# Altium footprint library Connectors.PcbLib: 268 footprints (part 9 of 21) (continued)
## CNMCH340-12 [mm] "MCH-1,2 horizontal connector plug 340 pin" (continued)
3D body: height -0.75, standoff -0.76, extent 5,1.539 5.483,7.495
3D body: height -0.75, standoff -0.76, extent 5.75,1.539 6.233,7.495
3D body: height -0.75, standoff -0.76, extent 2,0.777 2.483,7.495
3D body: height -0.75, standoff -0.76, extent 2.75,1.539 3.233,7.495
3D body: height -0.75, standoff -0.76, extent 3.5,1.539 3.983,7.495
3D body: height -0.75, standoff -0.76, extent -0.25,0.777 0.233,7.495
3D body: height -0.75, standoff -0.76, extent 0.5,1.539 0.983,7.495
3D body: height -0.75, standoff -0.76, extent 1.25,1.539 1.733,7.495
3D body: height -0.75, standoff -0.76, extent -2.5,0.777 -2.017,7.495
3D body: height -0.75, standoff -0.76, extent -1.75,1.539 -1.267,7.495
3D body: height -0.75, standoff -0.76, extent -1,1.539 -0.517,7.495
3D body: height -0.75, standoff -0.76, extent -4.75,0.777 -4.267,7.495
3D body: height -0.75, standoff -0.76, extent -4,1.539 -3.517,7.495
3D body: height -0.75, standoff -0.76, extent -3.25,1.539 -2.767,7.495
3D body: height -0.75, standoff -0.76, extent -7,0.777 -6.517,7.495
3D body: height -0.75, standoff -0.76, extent -6.25,1.539 -5.767,7.495
3D body: height -0.75, standoff -0.76, extent -5.5,1.539 -5.017,7.495
3D body: height -0.75, standoff -0.76, extent -9.25,0.777 -8.767,7.495
3D body: height -0.75, standoff -0.76, extent -8.5,1.539 -8.017,7.495
3D body: height -0.75, standoff -0.76, extent -7.75,1.539 -7.267,7.495
3D body: height -0.75, standoff -0.76, extent -11.5,0.777 -11.017,7.495
3D body: height -0.75, standoff -0.76, extent -10.75,1.539 -10.267,7.495
3D body: height -0.75, standoff -0.76, extent -10,1.539 -9.517,7.495
3D body: height -0.75, standoff -0.76, extent -13.75,0.777 -13.267,7.495
3D body: height -0.75, standoff -0.76, extent -13,1.539 -12.517,7.495
3D body: height -0.75, standoff -0.76, extent -12.25,1.539 -11.767,7.495
3D body: height -0.75, standoff -0.76, extent -16,0.777 -15.517,7.495
3D body: height -0.75, standoff -0.76, extent -15.25,1.539 -14.767,7.495
3D body: height -0.75, standoff -0.76, extent -14.5,1.539 -14.017,7.495
3D body: height -0.75, standoff -0.76, extent -18.25,0.777 -17.767,7.495
3D body: height -0.75, standoff -0.76, extent -17.5,1.539 -17.017,7.495
3D body: height -0.75, standoff -0.76, extent -16.75,1.539 -16.267,7.495
3D body: height -0.75, standoff -0.76, extent -20.5,0.777 -20.017,7.495
3D body: height -0.75, standoff -0.76, extent -19.75,1.539 -19.267,7.495
3D body: height -0.75, standoff -0.76, extent -19,1.539 -18.517,7.495
3D body: height -0.75, standoff -0.76, extent -22.75,0.777 -22.267,7.495
3D body: height -0.75, standoff -0.76, extent -22,1.539 -21.517,7.495
3D body: height -0.75, standoff -0.76, extent -21.25,1.539 -20.767,7.495
3D body: height -0.75, standoff -0.76, extent -25,0.777 -24.517,7.495
3D body: height -0.75, standoff -0.76, extent -24.25,1.539 -23.767,7.495
3D body: height -0.75, standoff -0.76, extent -23.5,1.539 -23.017,7.495
3D body: height -0.75, standoff -0.76, extent -27.25,0.777 -26.767,7.495
3D body: height -0.75, standoff -0.76, extent -26.5,1.539 -26.017,7.495
3D body: height -0.75, standoff -0.76, extent -25.75,1.539 -25.267,7.495
3D body: height -0.75, standoff -0.76, extent -29.5,0.777 -29.017,7.495
3D body: height -0.75, standoff -0.76, extent -28.75,1.539 -28.267,7.495
3D body: height -0.75, standoff -0.76, extent -28,1.539 -27.517,7.495
3D body: height -0.75, standoff -0.76, extent -30.25,1.539 -29.767,7.495
3D body: height -0.75, standoff -0.76, extent -31,1.539 -30.517,7.495
3D body: height -0.75, standoff -0.76, extent -31.75,0.777 -31.267,7.495
3D body: height 0.76, standoff 0.75, extent 29,0.766 29.483,7.495
3D body: height 0.76, standoff 0.75, extent 26.75,0.777 27.233,7.495
3D body: height 0.76, standoff 0.75, extent 27.5,1.223 27.983,7.495
3D body: height 0.76, standoff 0.75, extent 28.25,1.223 28.733,7.495
3D body: height 0.76, standoff 0.75, extent 31.267,0.777 31.75,7.495
3D body: height 0.76, standoff 0.75, extent 30.517,0.766 31,7.495
3D body: height 0.76, standoff 0.75, extent 29.767,2.112 30.25,7.495
3D body: height 0.76, standoff 0.75, extent 24.5,0.777 24.983,7.495
3D body: height 0.76, standoff 0.75, extent 25.25,0.766 25.733,7.495
3D body: height 0.76, standoff 0.75, extent 26,1.223 26.483,7.495
3D body: height 0.76, standoff 0.75, extent 22.25,0.777 22.733,7.495
3D body: height 0.76, standoff 0.75, extent 23,1.539 23.483,7.495
3D body: height 0.76, standoff 0.75, extent 23.75,1.539 24.233,7.495
3D body: height 0.76, standoff 0.75, extent 20,0.777 20.483,7.495
3D body: height 0.76, standoff 0.75, extent 20.75,1.539 21.233,7.495
3D body: height 0.76, standoff 0.75, extent 21.5,1.539 21.983,7.495
3D body: height 0.76, standoff 0.75, extent 17.75,0.777 18.233,7.495
3D body: height 0.76, standoff 0.75, extent 18.5,0.766 18.983,7.495
3D body: height 0.76, standoff 0.75, extent 19.25,1.223 19.733,7.495
3D body: height 0.76, standoff 0.75, extent 15.5,0.777 15.983,7.495
3D body: height 0.76, standoff 0.75, extent 16.25,1.539 16.733,7.495
3D body: height 0.76, standoff 0.75, extent 17,1.539 17.483,7.495
3D body: height 0.76, standoff 0.75, extent 13.25,0.777 13.733,7.495
3D body: height 0.76, standoff 0.75, extent 14,1.539 14.483,7.495
3D body: height 0.76, standoff 0.75, extent 14.75,1.539 15.233,7.495
3D body: height 0.76, standoff 0.75, extent 11,0.777 11.483,7.495
3D body: height 0.76, standoff 0.75, extent 11.75,0.766 12.233,7.495
3D body: height 0.76, standoff 0.75, extent 12.5,1.223 12.983,7.495
3D body: height 0.76, standoff 0.75, extent 8.75,0.777 9.233,7.495
3D body: height 0.76, standoff 0.75, extent 9.5,1.539 9.983,7.495
3D body: height 0.76, standoff 0.75, extent 10.25,1.539 10.733,7.495
3D body: height 0.76, standoff 0.75, extent 6.5,0.777 6.983,7.495
3D body: height 0.76, standoff 0.75, extent 7.25,1.539 7.733,7.495
3D body: height 0.76, standoff 0.75, extent 8,1.539 8.483,7.495
3D body: height 0.76, standoff 0.75, extent 4.25,0.777 4.733,7.495
3D body: height 0.76, standoff 0.75, extent 5,1.539 5.483,7.495
3D body: height 0.76, standoff 0.75, extent 5.75,1.539 6.233,7.495
3D body: height 0.76, standoff 0.75, extent 2,0.777 2.483,7.495
3D body: height 0.76, standoff 0.75, extent 2.75,1.539 3.233,7.495
3D body: height 0.76, standoff 0.75, extent 3.5,1.539 3.983,7.495
3D body: height 0.76, standoff 0.75, extent -0.25,0.777 0.233,7.495
3D body: height 0.76, standoff 0.75, extent 0.5,0.766 0.983,7.495
3D body: height 0.76, standoff 0.75, extent 1.25,1.223 1.733,7.495
3D body: height 0.76, standoff 0.75, extent -2.5,0.777 -2.017,7.495
3D body: height 0.76, standoff 0.75, extent -1.75,1.539 -1.267,7.495
3D body: height 0.76, standoff 0.75, extent -1,1.539 -0.517,7.495
3D body: height 0.76, standoff 0.75, extent -4.75,0.777 -4.267,7.495
3D body: height 0.76, standoff 0.75, extent -4,1.539 -3.517,7.495
3D body: height 0.76, standoff 0.75, extent -3.25,1.539 -2.767,7.495
3D body: height 0.76, standoff 0.75, extent -7,0.777 -6.517,7.495
3D body: height 0.76, standoff 0.75, extent -6.25,1.539 -5.767,7.495
3D body: height 0.76, standoff 0.75, extent -5.5,1.539 -5.017,7.495
3D body: height 0.76, standoff 0.75, extent -9.25,0.777 -8.767,7.495
3D body: height 0.76, standoff 0.75, extent -8.5,1.539 -8.017,7.495
3D body: height 0.76, standoff 0.75, extent -7.75,1.539 -7.267,7.495
3D body: height 0.76, standoff 0.75, extent -11.5,0.777 -11.017,7.495
3D body: height 0.76, standoff 0.75, extent -10.75,0.766 -10.267,7.495
3D body: height 0.76, standoff 0.75, extent -10,1.223 -9.517,7.495
3D body: height 0.76, standoff 0.75, extent -13.75,0.777 -13.267,7.495
3D body: height 0.76, standoff 0.75, extent -13,1.539 -12.517,7.495
3D body: height 0.76, standoff 0.75, extent -12.25,1.539 -11.767,7.495
3D body: height 0.76, standoff 0.75, extent -16,0.777 -15.517,7.495
3D body: height 0.76, standoff 0.75, extent -15.25,1.539 -14.767,7.495
3D body: height 0.76, standoff 0.75, extent -14.5,1.539 -14.017,7.495
3D body: height 0.76, standoff 0.75, extent -18.25,0.777 -17.767,7.495
3D body: height 0.76, standoff 0.75, extent -17.5,1.539 -17.017,7.495
3D body: height 0.76, standoff 0.75, extent -16.75,1.539 -16.267,7.495
3D body: height 0.76, standoff 0.75, extent -20.5,0.777 -20.017,7.495
3D body: height 0.76, standoff 0.75, extent -19.75,1.539 -19.267,7.495
3D body: height 0.76, standoff 0.75, extent -19,1.539 -18.517,7.495
3D body: height 0.76, standoff 0.75, extent -22.75,0.777 -22.267,7.495
3D body: height 0.76, standoff 0.75, extent -22,0.766 -21.517,7.495
3D body: height 0.76, standoff 0.75, extent -21.25,1.223 -20.767,7.495
3D body: height 0.76, standoff 0.75, extent -25,0.777 -24.517,7.495
3D body: height 0.76, standoff 0.75, extent -24.25,1.539 -23.767,7.495
3D body: height 0.76, standoff 0.75, extent -23.5,1.539 -23.017,7.495
3D body: height 0.76, standoff 0.75, extent -27.25,0.777 -26.767,7.495
3D body: height 0.76, standoff 0.75, extent -26.5,1.539 -26.017,7.495
3D body: height 0.76, standoff 0.75, extent -25.75,1.539 -25.267,7.495
3D body: height 0.76, standoff 0.75, extent -29.5,0.777 -29.017,7.495
3D body: height 0.76, standoff 0.75, extent -28.75,1.539 -28.267,7.495
3D body: height 0.76, standoff 0.75, extent -28,1.539 -27.517,7.495
3D body: height 0.76, standoff 0.75, extent -30.25,1.223 -29.767,7.495
3D body: height 0.76, standoff 0.75, extent -31,0.766 -30.517,7.495
3D body: height 0.76, standoff 0.75, extent -31.75,0.777 -31.267,7.495
3D body: height 9.01, standoff -3.01, extent 31.464,10.459 33.953,12.949
3D body: height 9.01, standoff -3.01, extent -33.953,10.459 -31.464,12.949
3D body: height -1.6, standoff -4.7, extent -35,20.5 35,35.5

## CNMMCX_J_EDGE [mm] "MMCX PCB edge female"
height 7.925
pads (4):
  rect 2x1.1 smd: 1(2,0)
  rect 2x1.4 smd: 2(2,-1.6) 2(2,1.6)
  rect 1.8x1.4 smd far side: 2(2,1.6)
Top Layer:
  region: 3,-0.9 0,-0.9 0,-1.75 -4.5,-1.75 -4.5,-2.6 3,-2.6
  region: 3,0.9 0,0.9 0,1.75 -4.5,1.75 -4.5,2.6 3,2.6
Bottom Layer:
  region: 3,0 1.1,0 1.1,-1.75 -4.5,-1.75 -4.5,-2.6 3,-2.6
  region: 3,0 1.1,0 1.1,1.75 -4.5,1.75 -4.5,2.6 3,2.6
Mechanical 13:
  lines w0.254: -4.5,-2.25 3,-2.25 3,2.25 -4.5,2.25 -4.5,-2.25
Mechanical 15:
  lines w0.254: -4.5,-2.6 -4.5,-1.75 ; -4.5,2.6 -4.5,1.75 ; -0.6,0 0,0 ; 0,-0.6 0,0 ; 0,0.6 0,0 ; 0.6,0 0,0 ; -4.5,-1.75 0,-1.75 0,1.75 -4.5,1.75 ; -4.5,-1.75 -4.5,-1.75 ; -4.5,1.75 -4.5,1.75
3D body "c-1408152-01-e-3d.stp": height 2.11, standoff -1.39, extent -4.5,-2.25 3,2.25

## CNPC4POWV [mm] "PC power  connector 4 pin"
height 10.16
pads (4):
  rrect50% 3.5x3.5 hole 1.8: 1(0,0)
  round 3.5 hole 1.8: 2(5,0) 3(10,0) 4(15,0)
Mechanical 13:
  circle w0.1: c0,0 r0.9
  circle w0.1: c5,0 r0.9
  circle w0.1: c10,0 r0.9
  circle w0.1: c15,0 r0.9
  lines w0.1: -4.1,-2.3 -4.1,4.1 19.5,4.1 19.5,-2.3 ; -4.1,-2.3 -2.3,-4.1 ; -4.1,-2.3 -4.1,-2.9 ccw(c-2.9,-2.9) -2.9,-4.1 -2.3,-4.1 ; -2.3,-4.1 17.7,-4.1 ; 17.7,-4.1 19.5,-2.3 ; 17.7,-4.1 18.3,-4.1 ccw(c18.3,-2.9) 19.5,-2.9 19.5,-2.3 ; -3.2,-1.8 -1.8,-3.2 17.2,-3.2 18.6,-1.8 18.6,3.2 -3.2,3.2 -3.2,-1.8
3D body: height 1.5, standoff 0, extent -4.1,-4.1 19.5,4.1
3D body: height 10.16, standoff 1.5, extent -4.1,-4.1 19.5,4.1
3D body: height 8.3, standoff 0, extent -0.9,-0.9 0.9,0.9
3D body: height 8.3, standoff 0, extent 4.1,-0.9 5.9,0.9
3D body: height 8.3, standoff 0, extent 9.1,-0.9 10.9,0.9
3D body: height 8.3, standoff 0, extent 14.1,-0.9 15.9,0.9

## CNPCIE_X1_18H [mm] "Connector PCI Express Horizontal female, SMTP; 18 pin; R0.64 mm; Body 30.48 x 13.79 x 7.65 mm (LxWxH)"
height 7.65
pads (58):
  round 0.7 on Mech12: 1(10.871,4.126) 2(12.071,4.126) 3(13.271,4.126) 4(13.265,2.425) 5(13.265,1.225) 6(13.265,0.025) 7(13.271,-1.626) 8(12.071,-1.626) 9(10.871,-1.626) 10(10.865,0.025) 11(10.865,1.225) 12(10.865,2.425) 13(-10.859,-1.626) 14(-12.059,-1.626) 15(-13.259,-1.626) 16(-13.265,0.025) 17(-10.865,0.025) 18(-10.865,1.225) 19(-13.265,1.225) 20(-13.265,2.425) 21(-10.865,2.425) 22(-10.859,4.126) 23(-12.059,4.126) 24(-13.259,4.126)
  rect 1.55x2.05 on Top Paste: 14(-13,-1.175) 14(-13,1.225) 14(-13,3.625) 14(-11.118,-1.175) 14(-11.118,1.225) 14(-11.118,3.625) 14(11.118,-1.175) 14(11.118,1.225) 14(11.118,3.625) 14(13,-1.175) 14(13,1.225) 14(13,3.625)
  rect 0.43x2.67 smd: A1(5.46,3.405) A2(4.18,3.405) A3(2.9,3.405) A4(1.62,3.405) A5(0.34,3.405) A6(-0.94,3.405) A7(-2.22,3.405) A8(-3.5,3.405) A9(-4.78,3.405) B1(4.82,3.405) B2(3.54,3.405) B3(2.26,3.405) B4(0.98,3.405) B5(-0.3,3.405) B6(-1.58,3.405) B7(-2.86,3.405) B8(-4.14,3.405) B9(-5.42,3.405)
  rect 3.68x7.03 smd paste-5.08: MH1(-12.065,1.225) MH2(12.065,1.225)
  round 1.524 hole 2.2 unplated mask+0.5: MH3(-7.35,0.076) MH4(7.35,0)
via 12.071,-1.626 diameter 0.65 hole 0.3
via 10.871,-1.626 diameter 0.65 hole 0.3
via 13.271,-1.626 diameter 0.65 hole 0.3
via 13.271,4.126 diameter 0.65 hole 0.3
via 10.871,4.126 diameter 0.65 hole 0.3
via 12.071,4.126 diameter 0.65 hole 0.3
via 10.865,2.425 diameter 0.65 hole 0.3
via 10.865,0.025 diameter 0.65 hole 0.3
via 10.865,1.225 diameter 0.65 hole 0.3
via 13.265,1.225 diameter 0.65 hole 0.3
via 13.265,0.025 diameter 0.65 hole 0.3
via 13.265,2.425 diameter 0.65 hole 0.3
via -10.865,2.425 diameter 0.65 hole 0.3
via -10.865,0.025 diameter 0.65 hole 0.3
via -10.865,1.225 diameter 0.65 hole 0.3
via -13.265,1.225 diameter 0.65 hole 0.3
via -13.265,0.025 diameter 0.65 hole 0.3
via -13.265,2.425 diameter 0.65 hole 0.3
via -12.059,4.126 diameter 0.65 hole 0.3
via -13.259,4.126 diameter 0.65 hole 0.3
via -10.859,4.126 diameter 0.65 hole 0.3
via -10.859,-1.626 diameter 0.65 hole 0.3
via -13.259,-1.626 diameter 0.65 hole 0.3
via -12.059,-1.626 diameter 0.65 hole 0.3
Mechanical 13:
  lines w0.102: -13.657,-6.832 -13.657,-10.832 -10.457,-10.832 -10.457,-6.832 ; -13.357,-4.232 -13.357,-3.032 ; -12.957,-6.832 -12.957,-4.232 ; -11.157,-6.832 -11.157,-4.232 ; -10.757,-4.232 -10.757,-3.032 ; -7.94,-3.06 -7.94,-9.4 7.94,-9.4 7.94,-3.06 ; 10.473,-6.832 10.473,-10.832 13.673,-10.832 13.673,-6.832 ; 10.773,-4.232 10.773,-3.032 ; 11.173,-6.832 11.173,-4.232 ; 12.973,-6.832 12.973,-4.232 ; 13.373,-4.232 13.373,-3.032 ; -15.24,-3.05 -15.24,4.75 -7.94,4.75 -7.94,2.515 7.94,2.515 7.94,4.75 15.24,4.75 15.24,-3.05 -15.24,-3.05 ; -13.857,-6.832 -13.857,-4.232 -10.257,-4.232 -10.257,-6.832 -13.857,-6.832 ; 10.273,-6.832 10.273,-4.232 13.873,-4.232 13.873,-6.832 10.273,-6.832
Mechanical 15:
  lines w0.102: -15.8,-3.4 -15.8,6 15.8,6 15.8,-3.4 8.475,-3.4 8.475,-9.97 -8.525,-9.97 -8.525,-3.4 -15.8,-3.4
3D body: height 5.1, standoff 2.51, extent 10.763,-4.232 13.357,-3.05
3D body: height 5.6, standoff 2.01, extent 10.265,-6.832 13.857,-4.232
3D body: height 5.4, standoff 2.21, extent 10.464,-10.832 13.657,-6.832
3D body: height 5.4, standoff 2.21, extent -13.657,-10.832 -10.464,-6.832
3D body: height 5.6, standoff 2.01, extent -13.857,-6.832 -10.265,-4.232
3D body: height 5.1, standoff 2.51, extent -13.357,-4.232 -10.763,-3.05
3D body: height 0, standoff -1.78, extent -8.45,-1.024 -6.25,1.176
3D body: height 0, standoff -1.78, extent 6.25,-1.1 8.45,1.1
3D body: height 7.5, standoff 0, extent -15.24,-3.04 15.24,-2.3
3D body: height 7.65, standoff 7, extent -15.24,-3.05 15.24,2.083
3D body: height 6.78, standoff 1.7, extent -7.976,-9.4 7.915,-3.05
3D body: height 7, standoff 0, extent -15.24,-2.311 15.24,4.75
3D body: height 6.3, standoff 2.2, extent -7.569,-9.423 7.569,-9.4

## CNPCIEX1EDGE [mm] "PCIexpress connector for board edge 2x18 pin (11+7)"
pads (36):
  rect 0.7x3.2 smd far side: A1(0,0.5)
  rect 0.7x4.2 smd far side: A2(1,0) A3(2,0) A4(3,0) A5(4,0) A6(5,0) A7(6,0) A8(7,0) A9(8,0) A10(9,0) A11(10,0) A12(13,0) A13(14,0) A14(15,0) A15(16,0) A16(17,0) A17(18,0) A18(19,0)
  rect 0.7x4.2 smd: B1(0,0) B2(1,0) B3(2,0) B4(3,0) B5(4,0) B6(5,0) B7(6,0) B8(7,0) B9(8,0) B10(9,0) B11(10,0) B12(13,0) B13(14,0) B14(15,0) B15(16,0) B16(17,0) B18(19,0)
  rect 0.7x3.2 smd: B17(18,0.5)
Mechanical 15:
  lines w0.127: -2.9,7.3 -0.65,7.3 -0.65,-2.725 0.125,-3.5 9.85,-3.5 10.55,-2.8 10.55,2.625 cw(c11.5,2.625) 12.45,2.625 12.45,-2.775 13.175,-3.5 18.925,-3.5 19.65,-2.775 19.65,7.3 22.2,7.3

## CNPCIEX4EDGE [mm] "PCIexpress connector for board edge 2x32 pin"
pads (64):
  rect 0.7x3.2 smd far side paste-3: A1(0,0.5)
  rect 0.7x4.2 smd far side paste-3: A2(1,0) A3(2,0) A4(3,0) A5(4,0) A6(5,0) A7(6,0) A8(7,0) A9(8,0) A10(9,0) A11(10,0) A12(13,0) A13(14,0) A14(15,0) A15(16,0) A16(17,0) A17(18,0) A18(19,0) A19(20,0) A20(21,0) A21(22,0) A22(23,0) A23(24,0) A24(25,0) A25(26,0) A26(27,0) A27(28,0) A28(29,0) A29(30,0) A30(31,0) A31(32,0) A32(33,0)
  rect 0.7x4.2 smd paste-3: B1(0,0) B2(1,0) B3(2,0) B4(3,0) B5(4,0) B6(5,0) B7(6,0) B8(7,0) B9(8,0) B10(9,0) B11(10,0) B12(13,0) B13(14,0) B14(15,0) B15(16,0) B16(17,0) B18(19,0) B19(20,0) B20(21,0) B21(22,0) B22(23,0) B23(24,0) B24(25,0) B25(26,0) B26(27,0) B27(28,0) B28(29,0) B29(30,0) B30(31,0) B32(33,0)
  rect 0.7x3.2 smd paste-3: B17(18,0.5) B31(32,0.5)
Top Solder:
  region: -0.65,2.2 -0.65,-2.75 0.1,-3.5 9.8,-3.5 10.55,-2.75 10.55,2.2
  region: 12.45,2.2 12.45,-2.75 13.2,-3.5 32.9,-3.5 33.65,-2.75 33.65,2.2
Bottom Solder:
  region: -0.65,2.2 -0.65,-2.75 0.1,-3.5 9.8,-3.5 10.55,-2.75 10.55,2.2
  region: 12.45,2.2 12.45,-2.75 13.2,-3.5 32.9,-3.5 33.65,-2.75 33.65,2.2
Mechanical 15:
  lines w0.127: -2.9,7.3 -1.15,7.3 -0.65,6.8 -0.65,-2.75 0.1,-3.5 9.8,-3.5 10.55,-2.75 10.55,2.625 cw(c11.5,2.625) 12.45,2.625 12.45,-2.75 13.2,-3.5 32.9,-3.5 33.65,-2.75 33.65,6.8 34.15,7.3 36.2,7.3

## CNPCIEX8EDGE [mm] "PCIexpress connector for board edge 2x49 pin"
pads (98):
  rect 0.7x3.2 smd far side paste-3: A1(-11.5,4)
  rect 0.7x4.2 smd far side paste-3: A2(-10.5,3.5) A3(-9.5,3.5) A4(-8.5,3.5) A5(-7.5,3.5) A6(-6.5,3.5) A7(-5.5,3.5) A8(-4.5,3.5) A9(-3.5,3.5) A10(-2.5,3.5) A11(-1.5,3.5) A12(1.5,3.5) A13(2.5,3.5) A14(3.5,3.5) A15(4.5,3.5) A16(5.5,3.5) A17(6.5,3.5) A18(7.5,3.5) A19(8.5,3.5) A20(9.5,3.5) A21(10.5,3.5) A22(11.5,3.5) A23(12.5,3.5) A24(13.5,3.5) A25(14.5,3.5) A26(15.5,3.5) A27(16.5,3.5) A28(17.5,3.5) A29(18.5,3.5) A30(19.5,3.5) A31(20.5,3.5) A32(21.5,3.5) A33(22.5,3.5) A34(23.5,3.5) A35(24.5,3.5) A36(25.5,3.5) A37(26.5,3.5) A38(27.5,3.5) A39(28.5,3.5) A40(29.5,3.5) A41(30.5,3.5) A42(31.5,3.5) A43(32.5,3.5) A44(33.5,3.5) A45(34.5,3.5) A46(35.5,3.5) A47(36.5,3.5) A48(37.5,3.5) A49(38.5,3.5)
  rect 0.7x4.2 smd paste-3: B1(-11.5,3.5) B2(-10.5,3.5) B3(-9.5,3.5) B4(-8.5,3.5) B5(-7.5,3.5) B6(-6.5,3.5) B7(-5.5,3.5) B8(-4.5,3.5) B9(-3.5,3.5) B10(-2.5,3.5) B11(-1.5,3.5) B12(1.5,3.5) B13(2.5,3.5) B14(3.5,3.5) B15(4.5,3.5) B16(5.5,3.5) B18(7.5,3.5) B19(8.5,3.5) B20(9.5,3.5) B21(10.5,3.5) B22(11.5,3.5) B23(12.5,3.5) B24(13.5,3.5) B25(14.5,3.5) B26(15.5,3.5) B27(16.5,3.5) B28(17.5,3.5) B29(18.5,3.5) B30(19.5,3.5) B32(21.5,3.5) B33(22.5,3.5) B34(23.5,3.5) B35(24.5,3.5) B36(25.5,3.5) B37(26.5,3.5) B38(27.5,3.5) B39(28.5,3.5) B40(29.5,3.5) B41(30.5,3.5) B42(31.5,3.5) B43(32.5,3.5) B44(33.5,3.5) B45(34.5,3.5) B46(35.5,3.5) B47(36.5,3.5) B49(38.5,3.5)
  rect 0.7x3.2 smd paste-3: B17(6.5,4) B31(20.5,4) B48(37.5,4)
Top Solder:
  region: 0.95,5.7 0.95,0.5 1.45,0 38.65,0 39.15,0.5 39.15,5.7
  region: -12.15,5.7 -12.15,0.5 -11.65,0 -1.45,0 -0.95,0.5 -0.95,5.7
Bottom Solder:
  region: 0.95,5.7 0.95,0.5 1.45,0 38.65,0 39.15,0.5 39.15,5.7
  region: -12.15,5.7 -12.15,0.5 -11.65,0 -1.45,0 -0.95,0.5 -0.95,5.7
Mechanical 15:
  lines w0.127: -14.4,10.8 -12.65,10.8 -12.15,10.3 -12.15,0.5 -11.65,0 -1.45,0 -0.95,0.5 -0.95,6.125 cw(c0,6.125) 0.95,6.125 0.95,0.5 1.45,0 38.65,0 39.15,0.5 39.15,10.3 39.65,10.8 41.7,10.8

## CNPWRTAP1 [mm] "Power Tap, pressfit for Backplane, 10pin, R2.54"
height 9.1
pads (11):
  round 2 hole 1: 1(-5.08,-3.81) 1(-5.08,3.81) 1(-2.54,-3.81) 1(-2.54,3.81) 1(0,-3.81) 1(0,3.81) 1(2.54,-3.81) 1(2.54,3.81) 1(5.08,-3.81) 1(5.08,3.81)
  rect 11.56x9.02 smd paste-10: 1(0,0)
Mechanical 13:
  circle w0.127: c0,0 r2.5
  lines w0.102: -6,-4.32 6,-4.32 6,4.32 -6,4.32 -6,-4.32
Mechanical 15:
  lines w0.102: -1,0 1,0 ; 0,-1 0,1
Mechanical 17:
  circle w1.15: c5.07,-3.81 r0.01
  circle w1.15: c2.53,-3.81 r0.01
  circle w1.15: c-0.01,-3.81 r0.01
  circle w1.15: c-2.55,-3.81 r0.01
  circle w1.15: c-5.09,-3.81 r0.01
  circle w1.15: c5.07,3.81 r0.01
  circle w1.15: c2.53,3.81 r0.01
  circle w1.15: c-0.01,3.81 r0.01
  circle w1.15: c-2.55,3.81 r0.01
  circle w1.15: c-5.09,3.81 r0.01
  text "Finished hole: 1 + 0.09 - 0.06 mm" at -5.969,5.207 h2.5
  text "Drilled hole: 1.15 ± 0.025  mm" at -5.969,7.239 h2.5
3D body: height 6.1, standoff 5.1, extent -5.08,-4.32 5.08,4.32
3D body: height 6.1, standoff 4.1, extent -5.08,-4.32 5.08,-3.302
3D body: height 6.1, standoff 4.1, extent -5.08,3.302 5.08,4.32
3D body: height 4.1, standoff 0.9, extent -6,-4.32 6,-3.3
3D body: height 4.1, standoff 0.9, extent -6,3.3 6,4.32
3D body: height 0.9, standoff -3, extent -5.461,3.556 -4.699,4.064
3D body: height 0.9, standoff -3, extent -2.921,3.556 -2.159,4.064
3D body: height 0.9, standoff -3, extent -0.381,3.556 0.381,4.064
3D body: height 0.9, standoff -3, extent 2.159,3.556 2.921,4.064
3D body: height 0.9, standoff -3, extent 4.699,3.556 5.461,4.064
3D body: height 0.9, standoff -3, extent 4.699,-4.064 5.461,-3.556
3D body: height 0.9, standoff -3, extent 2.159,-4.064 2.921,-3.556
3D body: height 0.9, standoff -3, extent -0.381,-4.064 0.381,-3.556
3D body: height 0.9, standoff -3, extent -2.921,-4.064 -2.159,-3.556
3D body: height 0.9, standoff -3, extent -5.461,-4.064 -4.699,-3.556

## CNRJ9H-1 [mm]
pads (6):
  round 1.5 hole 0.9: 1(-1.905,6.35) 2(-0.635,8.89) 3(0.635,6.35) 4(1.905,8.89)
  round 0 hole 3.2 unplated mask+2: MH1(-3.81,0) MH2(3.81,0)
Mechanical 13:
  lines w0.102: -5.588,-10.414 5.588,-10.414 5.588,10.16 -5.588,10.16 -5.588,-10.414
3D body: height 16, standoff 0, extent -5.588,-10.414 5.588,10.16

## CNRJ9H-2 [mm] "4 pin horizontal PCB RJ connector R1.27"
height 11.5
pads (6):
  round 1.5 hole 0.9: 1(-1.905,5.21) 2(-0.635,7.75) 3(0.635,5.21) 4(1.905,7.75)
  round 0 hole 3.2 unplated mask+2: MH1(-3.81,-1.15) MH2(3.81,-1.15)
Mechanical 13:
  lines w0.1: -5.6,-9.05 5.6,-9.05 5.6,9.05 -5.6,9.05 -5.6,-9.05
3D body "RJ22-215875-1.stp": height 11.52, standoff -3.18, extent -5.6,-9.05 5.6,9.05

## CNRJ25H-1 [mm]
pads (10):
  round 1.5 hole 0.9: 1(-3.175,8.89) 2(-1.905,6.35) 3(-0.635,8.89) 4(0.635,6.35) 5(1.905,8.89) 6(3.175,6.35)
  round 0 hole 3.2 unplated mask+2: MH1(-5.08,0) MH2(5.08,0)
  round 2.4 hole 1.6: MH3(-6.858,-3.048) MH4(6.858,-3.048)
Mechanical 13:
  lines w0.102: -7,-5.5 -7.9,-5.5 -7.9,-4.1 -7,-4.1 ; 7,-5.5 7.9,-5.5 7.9,-4.1 7,-4.1 ; -7,-8.3 7,-8.3 7,10.16 -7,10.16 -7,-8.3
Mechanical 15:
  lines w0.102: -6.985,-5.207 6.985,-5.207 ; -1.016,0 1.016,0 ; 0,-1.016 0,1.016
3D body: height 11.43, standoff 3.81, extent 7,-5.5 7.9,-4.1
3D body: height 11.43, standoff 3.81, extent -7.9,-5.5 -7,-4.1
3D body: height 12.7, standoff 0, extent -7,-8.3 7,10.16

## CNRJ25H-2 [mm] "6 pin horizontal PCB RJ connector R1.27"
height 11.5
pads (8):
  round 1.5 hole 0.9: 1(-3.17,7.55) 2(-1.9,5.01) 3(-0.63,7.55) 4(0.64,5.01) 5(1.91,7.55) 6(3.18,5.01)
  round 0 hole 3.2 unplated mask+2: MH1(-5.08,-1.35) MH2(5.08,-1.35)
Mechanical 13:
  lines w0.1: -6.6,-9.25 6.6,-9.25 6.6,8.85 -6.6,8.85 -6.6,-9.25
3D body "RJ25-215876-1.stp": height 11.52, standoff -3.18, extent -6.6,-9.25 6.6,8.85

## CNRJ45ETH1 [mm] "Ethernet connector horizontal short"
height 13.3
pads (16):
  rrect50% 1.55x1.55 hole 0.9: 1(2.54,-4.445)
  round 1.55 hole 0.9: 2(4.318,-3.175) 3(2.54,-1.905) 4(4.318,-0.635) 5(2.54,0.635) 6(4.318,1.905) 7(2.54,3.175) 8(4.318,4.445) A1(9.144,-4.572) A2(9.144,6.858) C1(9.144,-6.858) C2(9.144,4.572)
  round 0 hole 3.3 unplated mask+1.8: MH1(0,-6.35) MH2(0,6.35)
  round 2.2 hole 1.6: SH1(3.429,8.128) SH2(3.429,-8.128)
Top Overlay:
  lines w0.15: 4.826,-8.255 10.541,-8.255 10.541,8.255 4.826,8.255
Mechanical 13:
  lines w0.102: -5.283,-8.128 -5.283,8.128 10.465,8.128 10.465,-8.128 -5.283,-8.128
Mechanical 15:
  lines w0.102: -1,0 1,0 ; 0,-1 0,1
3D body: height 13.33, standoff 0, extent -5.283,-8.128 10.465,8.128

## CNRJ45MAG1 [mm] "Ethernet connector with magnetics and 2 LED"
height 13.3
pads (16):
  rrect50% 1.55x1.55 hole 0.9: 1(6.89,4.445)
  round 1.55 hole 0.9: 2(9.43,3.175) 3(6.89,1.905) 4(9.43,0.635) 5(6.89,-0.635) 6(9.43,-1.905) 7(6.89,-3.175) 8(9.43,-4.445) L1(-8.08,6.44) L2(-8.08,3.9) L3(-8.08,-6.44) L4(-8.08,-3.9)
  round 0 hole 3.3 unplated mask+1.8: MH1(-3.7,-5.7) MH2(-3.7,5.7)
  round 2.2 hole 1.6: SH1(0,7.7) SH2(0,-7.7)
Top Overlay:
  lines w0.15: -9,-8.1 -1.5,-8.1 ; -9,8.1 -1.5,8.1 ; 1.5,-8.1 10,-8.1 10,-5.4 ; 1.5,8.1 10,8.1 10,4.2
Mechanical 13:
  lines w0.102: -8.075,-8.35 -14.4,-8.35 -15,-7.75 ; -8.05,8.35 -14.4,8.35 -15,7.75 ; -15,-7.75 -15,7.75 ; -15,-7.75 9.9,-7.75 9.9,7.75 -15,7.75
Mechanical 15:
  lines w0.102: -1,0 1,0 ; 0,-1 0,1
3D body: height 11.6, standoff 2.2, extent -14.6,-6.8 3.4,6.8
3D body: height 11.6, standoff 11, extent -14.732,-4.699 3.302,-4.191
3D body: height 11.6, standoff 11, extent -14.732,-3.429 3.302,-2.921
3D body: height 11.6, standoff 11, extent -14.732,-2.159 3.302,-1.651
3D body: height 11.6, standoff 11, extent -14.732,4.191 3.302,4.699
3D body: height 11.6, standoff 11, extent -14.732,2.921 3.302,3.429
3D body: height 11.6, standoff 11, extent -14.732,1.651 3.302,2.159
3D body: height 11.6, standoff 11, extent -14.732,0.381 3.302,0.889
3D body: height 11.6, standoff 11, extent -14.732,-0.889 3.302,-0.381
3D body: height 2.2, standoff 1.5, extent -15.3,-5.9 -15,-4.3
3D body: height 2.2, standoff 1.5, extent -15.3,4.3 -15,5.9
3D body: height 13.3, standoff 11.6, extent -15,-7.75 9.9,7.75
3D body: height 11.6, standoff 4.3, extent -15,-7.75 9.9,7.75
3D body: height 4.3, standoff 2.2, extent -15,-7.75 9.9,7.75
3D body: height 0.5, standoff 0, extent -15,-7.75 9.9,7.75
3D body: height 2.2, standoff 0.5, extent -15,-7.75 9.9,7.75

## CNRJ45MAG2 [mm]
pads (16):
  rrect50% 1.55x1.55 hole 0.9: 1(4.445,-6.35)
  round 1.55 hole 0.9: 2(3.175,-8.89) 3(1.905,-6.35) 4(0.635,-8.89) 5(-0.635,-6.35) 6(-1.905,-8.89) 7(-3.175,-6.35) 8(-4.445,-8.89)
  round 1.65 hole 1: 9(5.46,-13.725) 10(2.92,-13.72) 11(-2.92,-13.72) 12(-5.46,-13.72)
  round 0 hole 3.2 unplated mask+1.8: MH1(-5.715,0) MH2(5.715,0)
  round 2.2 hole 1.6: SH1(7.87,-3.05) SH2(-7.87,-3.05)
Top Overlay:
  lines w0.15: -8.1,-4.45 -8.1,-14.85 8.1,-14.85 8.1,-4.45 ; -8.1,-1.675 -8.1,9 ; 8.1,-1.675 8.1,9
Keep-Out Layer:
  circle w0.102: c-5.715,0 r1.778
  circle w0.102: c5.715,0 r1.778
Mechanical 13:
  lines w0.102: -8.1,-14.6 -8.1,10.725 8.1,10.725 8.1,-14.6 -8.1,-14.6
  lines w0.127: -9.1,5 -9.1,9 -9.1,9.725 -8.1,10.725 ; 8.1,10.725 9.1,9.725 9.1,9 9.1,5
Mechanical 15:
  lines w0.102: -1,0 1,0 ; 0,-1 0,1
3D body: height 13.3, standoff 0, extent -8.1,-14.6 8.1,10.725